# Altium footprint library Cyberdeck.PcbLib: 261 footprints (part 16 of 17)
Each footprint in its own frame and in the unit in brackets; x right, y up, seen from the top. Pads: shape width x height; smd on the part's side, far side on the other; paste and mask are expansions set on the pad; w line width, h text height; cw(c..) or ccw(c..) is an arc to the next point about the centre after c.
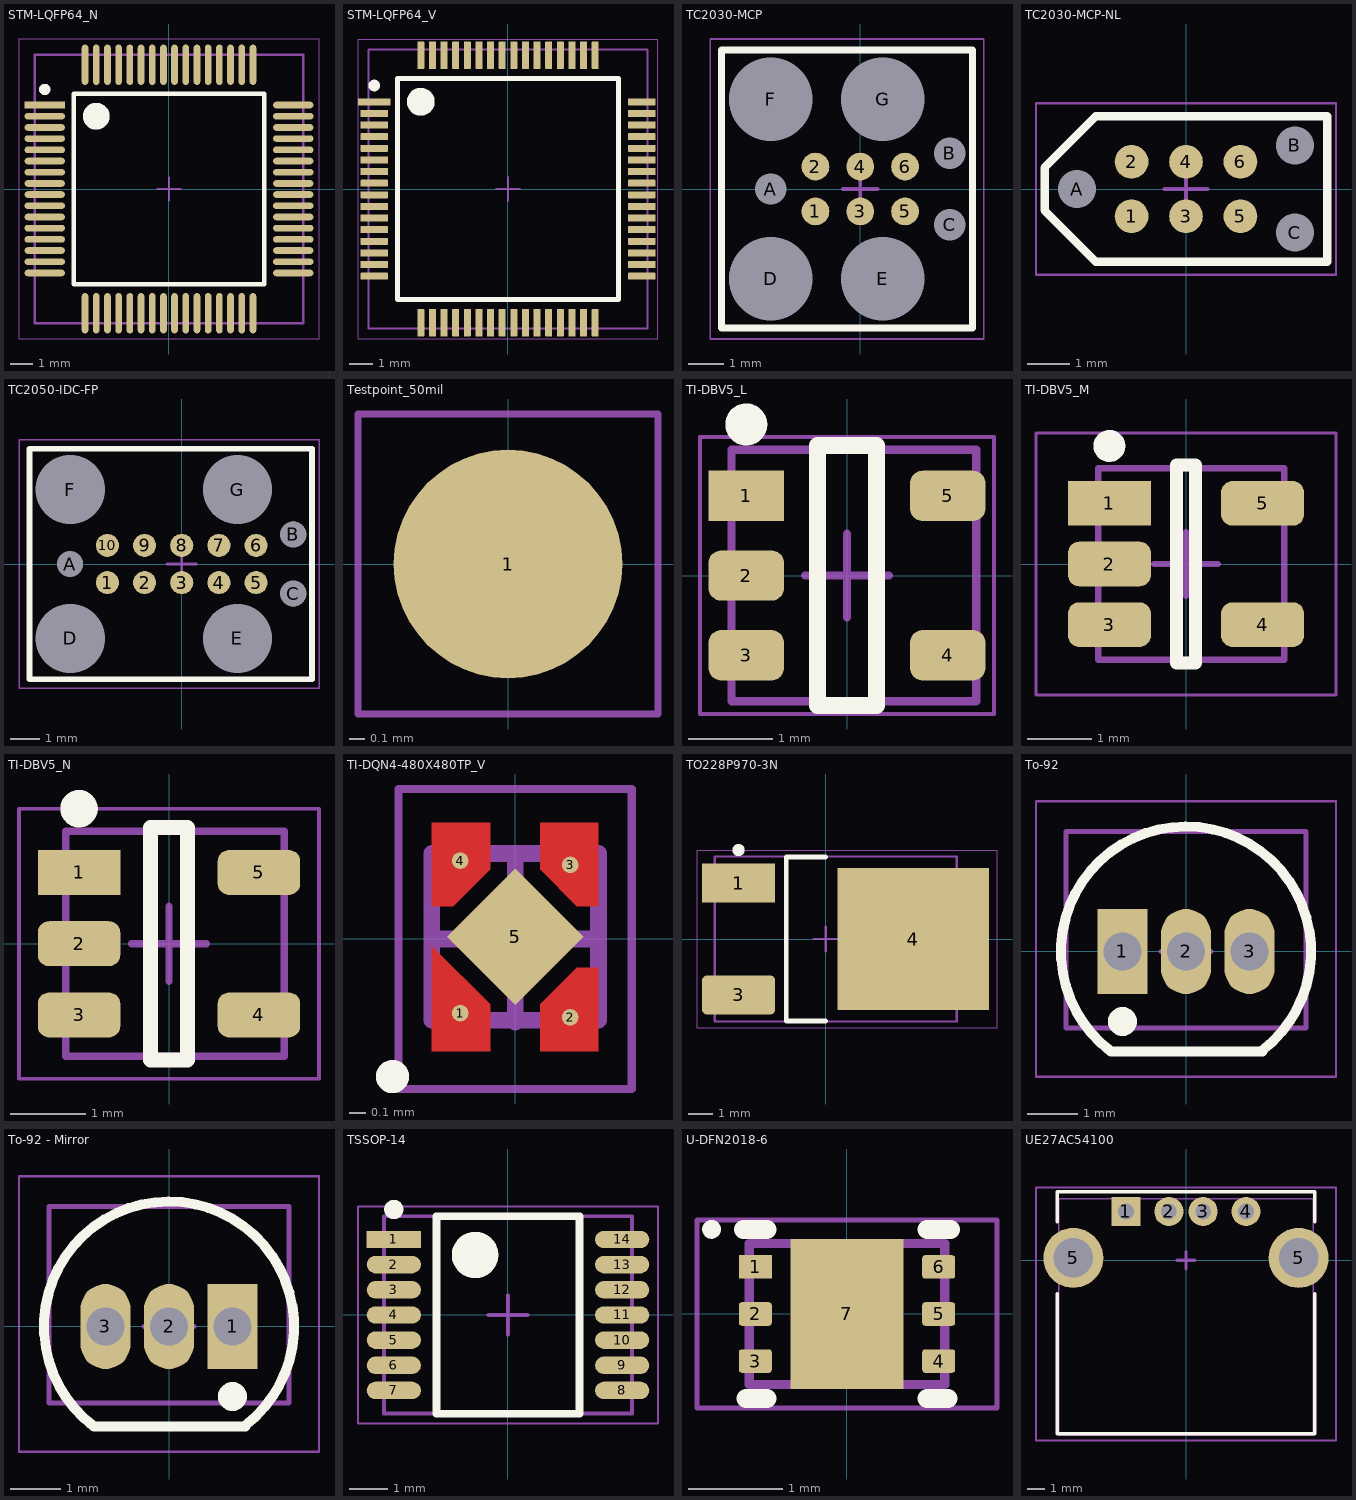
[diagram p15: the footprints below, top view; thin cyan lines are the x and y axes]

## STM-LQFP64_N [mm] "Thin QFP, 64-Leads, Body 10x10mm, Pitch 0.5mm, IPC Medium Density"
height 1.6
pads (64):
  rect 1.8x0.3 smd: 1(-5.55,3.75)
  oval 1.8x0.3 smd: 2(-5.55,3.25) 3(-5.55,2.75) 4(-5.55,2.25) 5(-5.55,1.75) 6(-5.55,1.25) 7(-5.55,0.75) 8(-5.55,0.25) 9(-5.55,-0.25) 10(-5.55,-0.75) 11(-5.55,-1.25) 12(-5.55,-1.75) 13(-5.55,-2.25) 14(-5.55,-2.75) 15(-5.55,-3.25) 16(-5.55,-3.75) 33(5.55,-3.75) 34(5.55,-3.25) 35(5.55,-2.75) 36(5.55,-2.25) 37(5.55,-1.75) 38(5.55,-1.25) 39(5.55,-0.75) 40(5.55,-0.25) 41(5.55,0.25) 42(5.55,0.75) 43(5.55,1.25) 44(5.55,1.75) 45(5.55,2.25) 46(5.55,2.75) 47(5.55,3.25) 48(5.55,3.75)
  oval 0.3x1.8 smd: 17(-3.75,-5.55) 18(-3.25,-5.55) 19(-2.75,-5.55) 20(-2.25,-5.55) 21(-1.75,-5.55) 22(-1.25,-5.55) 23(-0.75,-5.55) 24(-0.25,-5.55) 25(0.25,-5.55) 26(0.75,-5.55) 27(1.25,-5.55) 28(1.75,-5.55) 29(2.25,-5.55) 30(2.75,-5.55) 31(3.25,-5.55) 32(3.75,-5.55) 49(3.75,5.55) 50(3.25,5.55) 51(2.75,5.55) 52(2.25,5.55) 53(1.75,5.55) 54(1.25,5.55) 55(0.75,5.55) 56(0.25,5.55) 57(-0.25,5.55) 58(-0.75,5.55) 59(-1.25,5.55) 60(-1.75,5.55) 61(-2.25,5.55) 62(-2.75,5.55) 63(-3.25,5.55) 64(-3.75,5.55)
Top Overlay:
  circle w0.25: c-5.55,4.45 r0.125
  circle w0.6: c-3.25,3.25 r0.3
  lines w0.2: -4.25,-4.25 -4.25,4.25 4.25,4.25 4.25,-4.25 -4.25,-4.25
Assembly Top:
  lines w0.1: -6,-6 6,-6 6,6 -6,6 -6,-6
Courtyard Top:
  lines w0.05: -6.7,-6.7 -6.7,6.7 6.7,6.7 6.7,-6.7 -6.7,-6.7
  lines w0.1: -0.5,0 0.5,0 ; 0,-0.5 0,0.5
3D body "TSQFP50P1200X1200X160-64N.step": height 1.6, standoff 0, extent -6,-6 6,6

## STM-LQFP64_V [mm] "Thin QFP, 64-Leads, Body 10x10mm, Pitch 0.5mm, ST Recommended"
height 1.6
pads (64):
  rect 1.4x0.3 smd: 1(-5.75,3.75)
  rrect25% 1.2x0.3 smd: 2(-5.75,3.25) 3(-5.75,2.75) 4(-5.75,2.25) 5(-5.75,1.75) 6(-5.75,1.25) 7(-5.75,0.75) 8(-5.75,0.25) 9(-5.75,-0.25) 10(-5.75,-0.75) 11(-5.75,-1.25) 12(-5.75,-1.75) 13(-5.75,-2.25) 14(-5.75,-2.75) 15(-5.75,-3.25) 16(-5.75,-3.75) 33(5.75,-3.75) 34(5.75,-3.25) 35(5.75,-2.75) 36(5.75,-2.25) 37(5.75,-1.75) 38(5.75,-1.25) 39(5.75,-0.75) 40(5.75,-0.25) 41(5.75,0.25) 42(5.75,0.75) 43(5.75,1.25) 44(5.75,1.75) 45(5.75,2.25) 46(5.75,2.75) 47(5.75,3.25) 48(5.75,3.75)
  rrect25% 0.3x1.2 smd: 17(-3.75,-5.75) 18(-3.25,-5.75) 19(-2.75,-5.75) 20(-2.25,-5.75) 21(-1.75,-5.75) 22(-1.25,-5.75) 23(-0.75,-5.75) 24(-0.25,-5.75) 25(0.25,-5.75) 26(0.75,-5.75) 27(1.25,-5.75) 28(1.75,-5.75) 29(2.25,-5.75) 30(2.75,-5.75) 31(3.25,-5.75) 32(3.75,-5.75) 49(3.75,5.75) 50(3.25,5.75) 51(2.75,5.75) 52(2.25,5.75) 53(1.75,5.75) 54(1.25,5.75) 55(0.75,5.75) 56(0.25,5.75) 57(-0.25,5.75) 58(-0.75,5.75) 59(-1.25,5.75) 60(-1.75,5.75) 61(-2.25,5.75) 62(-2.75,5.75) 63(-3.25,5.75) 64(-3.75,5.75)
Top Overlay:
  circle w0.25: c-5.75,4.45 r0.125
  circle w0.6: c-3.75,3.75 r0.3
  lines w0.2: -4.75,-4.75 -4.75,4.75 4.75,4.75 4.75,-4.75 -4.75,-4.75
Assembly Top:
  lines w0.1: -6,-6 -6,6 6,6 6,-6 -6,-6
Courtyard Top:
  lines w0.05: -6.45,-6.45 -6.45,6.45 6.45,6.45 6.45,-6.45 -6.45,-6.45
  lines w0.1: -0.5,0 0.5,0 ; 0,-0.5 0,0.5
3D body "TSQFP50P1200X1200X160-64N.step": height 1.6, standoff 0, extent -6,-6 6,6

## TC2030-MCP [mil]
pads (13):
  round 31 smd: 1(-50,-25) 2(-50,25) 3(0,-25) 4(0,25) 5(50,-25) 6(50,25)
  round 34 hole 35 unplated: A(-100,0) B(100,40) C(100,-40)
  round 92 hole 93 unplated: D(-100,-100) E(25,-100) F(-100,100) G(25,100)
Top Overlay:
  lines w7.87: -155,-155 -155,155 125,155 125,-155 -155,-155
Courtyard Top:
  lines w1.97: -167.32,-167.32 137.8,-167.32 137.8,167.32 -167.32,167.32 -167.32,-167.32
  lines w3.94: -19.68,0 19.68,0 ; 0,-19.68 0,19.68

## TC2030-MCP-NL [mil]
pads (9):
  round 31 smd paste-78.74: 1(-50,-25) 2(-50,25) 3(0,-25) 4(0,25) 5(50,-25) 6(50,25)
  round 34 hole 35 unplated: A(-100,0) B(100,40) C(100,-40)
Top Overlay:
  lines w7.87: -129.92,-19.68 -129.92,19.68 -82.68,66.93 129.92,66.93 129.92,-66.93 -82.68,-66.93 -129.92,-19.68
Courtyard Top:
  lines w1.97: -137.8,-78.74 137.8,-78.74 137.8,78.74 -137.8,78.74 -137.8,-78.74
  lines w3.94: -19.68,0 19.68,0 ; 0,-19.68 0,19.68

## TC2050-IDC-FP [mil] "footprint for test cable"
pads (17):
  round 31 smd paste-40: 1(-100,-25) 2(-50,-25) 3(0,-25) 4(50,-25) 5(100,-25) 6(100,25) 7(50,25) 8(0,25) 9(-50,25) 10(-100,25)
  round 34 hole 35 unplated: A(-150,0) B(150,40) C(150,-40)
  round 92 hole 93 unplated: D(-150,-100) E(75,-100) F(-150,100) G(75,100)
Top Overlay:
  lines w7.87: -205,-155 -205,155 175,155 175,-155 -205,-155
Courtyard Top:
  lines w1.97: -218.9,-167.32 184.65,-167.32 184.65,167.32 -218.9,167.32 -218.9,-167.32
  lines w3.94: -19.68,0 19.68,0 ; 0,-19.68 0,19.68

## Testpoint_50mil [mil] "Testpoint"
pads (1):
  round 60 smd paste-39.37: 1(0,0)
Courtyard Top:
  lines w1.97: -39.37,-39.37 39.37,-39.37 39.37,39.37 -39.37,39.37 -39.37,-39.37
  lines w3.94: -19.68,0 19.68,0 ; 0,-19.68 0,19.68

## TI-DBV5_L [mm] "SOT23, 5-Leads, Body 2.9x1.6mm, Pitch 0.95mm, IPC High Density"
height 1.45
pads (5):
  rect 0.9x0.6 smd: 1(-1.2,0.95)
  rrect50% 0.9x0.6 smd: 2(-1.2,0) 3(-1.2,-0.95) 4(1.2,-0.95) 5(1.2,0.95)
Top Overlay:
  circle w0.25: c-1.2,1.8 r0.125
  lines w0.2: -0.35,-1.55 0.35,-1.55 0.35,1.55 -0.35,1.55 -0.35,-1.55
Assembly Top:
  lines w0.1: -1.376,-1.5 -1.376,1.5 1.539,1.5 1.539,-1.5 -1.376,-1.5
Courtyard Top:
  lines w0.05: -1.75,-1.65 -1.75,1.65 1.75,1.65 1.75,-1.65 -1.75,-1.65
  lines w0.1: -0.5,0 0.5,0 ; 0,-0.5 0,0.5
3D body "DBV0005A.stp": height 1.1, standoff -0.19, extent -1.376,-1.461 1.538,1.46

## TI-DBV5_M [mm] "SOT23, 5-Leads, Body 2.9x1.6mm, Pitch 0.95mm, IPC Low Density"
height 1.45
pads (5):
  rect 1.3x0.7 smd: 1(-1.2,0.95)
  rrect50% 1.3x0.7 smd: 2(-1.2,0) 3(-1.2,-0.95) 4(1.2,-0.95) 5(1.2,0.95)
Top Overlay:
  circle w0.25: c-1.2,1.85 r0.125
  lines w0.2: -0.15,-1.55 0.15,-1.55 0.15,1.55 -0.15,1.55 -0.15,-1.55
Assembly Top:
  lines w0.1: -1.376,-1.5 1.539,-1.5 1.539,1.5 -1.376,1.5 -1.376,-1.5
Courtyard Top:
  lines w0.05: -2.35,-2.05 -2.35,2.05 2.35,2.05 2.35,-2.05 -2.35,-2.05
  lines w0.1: -0.5,0 0.5,0 ; 0,-0.5 0,0.5
3D body "DBV0005A.stp": height 1.1, standoff -0.19, extent -1.376,-1.461 1.538,1.46

## TI-DBV5_N [mm] "SOT23, 5-Leads, Body 2.9x1.6mm, Pitch 0.95mm, IPC Medium Density"
height 1.45
pads (5):
  rect 1.1x0.6 smd: 1(-1.2,0.95)
  rrect50% 1.1x0.6 smd: 2(-1.2,0) 3(-1.2,-0.95) 4(1.2,-0.95) 5(1.2,0.95)
Top Overlay:
  circle w0.25: c-1.2,1.8 r0.125
  lines w0.2: -0.25,-1.55 -0.25,1.55 0.25,1.55 0.25,-1.55 -0.25,-1.55
Assembly Top:
  lines w0.1: -1.376,-1.5 -1.376,1.5 1.539,1.5 1.539,-1.5 -1.376,-1.5
Courtyard Top:
  lines w0.05: -2,-1.8 2,-1.8 2,1.8 -2,1.8 -2,-1.8
  lines w0.1: -0.5,0 0.5,0 ; 0,-0.5 0,0.5
3D body "DBV0005A.stp": height 1.1, standoff -0.19, extent -1.376,-1.461 1.538,1.46

## TI-DQN4-480X480TP_V [mm] "SON, 4-Leads, Body 1x1mm, Pitch 0.65mm, Thermal Pad 0.5x0.5mm"
height 0.4
pads (5):
  round 0.1 smd: 1(-0.33,-0.444) 2(0.33,-0.47) 3(0.33,0.445) 4(-0.33,0.47)
  rect 0.58x0.58 smd rot 45: 5(0,0.013)
Top Layer:
  region: -0.15,-0.392 -0.15,-0.672 -0.5,-0.672 -0.5,-0.042
  region: 0.5,-0.172 0.37,-0.172 0.15,-0.392 0.15,-0.672 0.5,-0.672
  region: -0.15,0.698 -0.5,0.698 -0.5,0.198 -0.37,0.198 -0.15,0.418
  region: 0.5,0.698 0.15,0.698 0.15,0.418 0.37,0.198 0.5,0.198
Top Overlay:
  circle w0.1: c-0.736,-0.825 r0.05
Top Paste:
  region: -0.15,-0.392 -0.15,-0.672 -0.5,-0.672 -0.5,-0.042
  region: 0.5,-0.172 0.37,-0.172 0.15,-0.392 0.15,-0.672 0.5,-0.672
  region: -0.15,0.698 -0.5,0.698 -0.5,0.198 -0.37,0.198 -0.15,0.418
  region: 0.5,0.698 0.15,0.698 0.15,0.418 0.37,0.198 0.5,0.198
Assembly Top:
  lines w0.1: -0.5,-0.487 -0.5,0.513 0.5,0.513 0.5,-0.487 -0.5,-0.487
Courtyard Top:
  lines w0.05: -0.7,-0.9 0.7,-0.9 0.7,0.9 -0.7,0.9 -0.7,-0.9
  lines w0.1: -0.5,0 0.5,0 ; 0,-0.5 0,0.5
3D body: height 0.4, standoff 0, extent -0.5,-0.487 0.5,0.513

## TO228P970-3N [mm] "DPAK-3  CASE 369C OnSemi"
height 2.38
pads (3):
  rect 3x1.6 smd: 1(-3.575,2.29)
  rrect25% 3x1.6 smd: 3(-3.575,-2.29)
  rect 6.2x5.8 smd: 4(3.575,0)
Top Overlay:
  circle w0.25: c-3.575,3.64 r0.125
  lines w0.2: -0.025,-3.35 -1.625,-3.35 -1.625,3.35 -0.025,3.35
Assembly Top:
  lines w0.1: -4.55,-3.375 -4.55,3.375 5.355,3.375 5.355,-3.375 -4.55,-3.375
Courtyard Top:
  lines w0.05: -5.275,-3.625 -5.275,3.625 7,3.625 7,-3.625 -5.275,-3.625
  lines w0.1: -0.5,0 0.5,0 ; 0,-0.5 0,0.5
3D body "TO228P970-3N.step": height 2.38, standoff 0, extent -4.55,-3.4 5.355,3.35

## To-92 [mm]
pads (3):
  rect 1x1.7 hole 0.762: 1(-1.27,0)
  oval 1x1.7 hole 0.762: 2(0,0) 3(1.27,0)
Top Overlay:
  circle w0.3: c-1.27,-1.4 r0.14
  lines w0.2: 1.518,-1.986 ccw(c0,0) -1.5,-2 1.529,-2
Assembly Top:
  lines w0.1: -2.4,-1.53 -2.4,2.4 2.4,2.4 2.4,-1.53 -2.4,-1.53
Courtyard Top:
  lines w0.05: -3,-2.5 -3,3 3,3 3,-2.5 -3,-2.5
  lines w0.1: -0.5,0 0.5,0 ; 0,-0.5 0,0.5
3D body "ALSRobot-TO-92A.step": height 8, standoff -3, extent -2.4,-1.53 2.4,2.4

## To-92 - Mirror [mm]
pads (3):
  rect 1x1.7 hole 0.762: 1(1.27,0)
  oval 1x1.7 hole 0.762: 2(0,0) 3(-1.27,0)
Top Overlay:
  circle w0.3: c1.27,-1.4 r0.14
  lines w0.2: 1.518,-1.986 ccw(c0,0) -1.5,-2 1.529,-2
Assembly Top:
  lines w0.1: -2.4,-1.53 -2.4,2.4 2.4,2.4 2.4,-1.53 -2.4,-1.53
Courtyard Top:
  lines w0.05: -3,-2.5 -3,3 3,3 3,-2.5 -3,-2.5
  lines w0.1: -0.5,0 0.5,0 ; 0,-0.5 0,0.5
3D body "ALSRobot-TO-92A.step": height 8, standoff -3, extent -2.4,-1.53 2.4,2.4

## TSSOP-14 [mm] "TSOP, 14-Leads, Body 5.00x4.40mm, Pitch 0.65mm, IPC Medium Density"
height 1.2
pads (14):
  rect 1.4x0.45 smd: 1(-2.95,1.95)
  oval 1.4x0.45 smd: 2(-2.95,1.3) 3(-2.95,0.65) 4(-2.95,0) 5(-2.95,-0.65) 6(-2.95,-1.3) 7(-2.95,-1.95) 8(2.95,-1.95) 9(2.95,-1.3) 10(2.95,-0.65) 11(2.95,0) 12(2.95,0.65) 13(2.95,1.3) 14(2.95,1.95)
Top Overlay:
  circle w0.25: c-2.95,2.725 r0.125
  circle w0.6: c-0.85,1.55 r0.3
  lines w0.2: -1.85,-2.55 -1.85,2.55 1.85,2.55 1.85,-2.55 -1.85,-2.55
Assembly Top:
  lines w0.1: -3.2,-2.55 -3.2,2.55 3.2,2.55 3.2,-2.55 -3.2,-2.55
Courtyard Top:
  lines w0.05: -3.875,-2.8 -3.875,2.8 3.875,2.8 3.875,-2.8 -3.875,-2.8
  lines w0.1: -0.5,0 0.5,0 ; 0,-0.5 0,0.5
3D body "TSSOP-14.step": height 1.2, standoff 0, extent -3.2,-2.55 3.2,2.55

## U-DFN2018-6 [mm] "U-DFN2018-6"
height 0.61
pads (7):
  rect 0.35x0.25 smd: 1(-0.975,0.5)
  rrect25% 0.35x0.25 smd: 2(-0.975,0) 3(-0.975,-0.5) 4(0.975,-0.5) 5(0.975,0) 6(0.975,0.5)
  rect 1.2x1.6 smd: 7(0,0)
Top Overlay:
  circle w0.1: c-1.44,0.9 r0.05
  lines w0.2: -1.1,0.9 -0.85,0.9 ; -1.075,-0.9 -0.85,-0.9 ; 0.85,-0.9 1.075,-0.9 ; 0.85,0.9 1.1,0.9
Assembly Top:
  lines w0.1: -1.04,-0.75 -1.04,0.75 1.04,0.75 1.04,-0.75 -1.04,-0.75
Courtyard Top:
  lines w0.05: -1.595,-1 -1.595,1 1.595,1 1.595,-1 -1.595,-1
  lines w0.1: -0.5,0 0.5,0 ; 0,-0.5 0,0.5
3D body "SON127P600-8N.step": height 0.61, standoff 0, extent -1.041,-0.75 1.041,0.75

## UE27AC54100 [mm] "UE27AC54100"
height 7.2
pads (6):
  rect 1.7x1.7 hole 0.92: 1(-3.5,2.855)
  round 1.7 hole 0.92: 2(-1,2.855) 3(1,2.855) 4(3.5,2.855)
  round 3.5 hole 2.3: 5(-6.57,0.145) 5(6.57,0.145)
Top Overlay:
  lines w0.2: -7.5,-1.95 -7.5,-10.1 7.5,-10.1 7.5,-1.95 ; -7.5,2.25 -7.5,4 7.5,4 7.5,2.25
Assembly Top:
  lines w0.1: -7.423,-10.2 -7.423,3.6 7.424,3.6 7.424,-10.2 -7.423,-10.2
Courtyard Top:
  lines w0.1: -8.75,-10.5 8.75,-10.5 8.75,4.25 -8.75,4.25 -8.75,-10.5
  lines w0.2: -0.5,0 0.5,0 ; 0,-0.5 0,0.5
3D body "M-UE27-AC54-100-REVT1.STEP": height 7.61, standoff -3.13, extent -7.423,-10.2 7.424,3.6